# Altium footprint library PcbLib_jp.PcbLib: 255 footprints (part 4 of 16)
Each footprint in its own frame and in the unit in brackets; x right, y up, seen from the top. Pads: shape width x height; smd on the part's side, far side on the other; paste and mask are expansions set on the pad; w line width, h text height; cw(c..) or ccw(c..) is an arc to the next point about the centre after c.
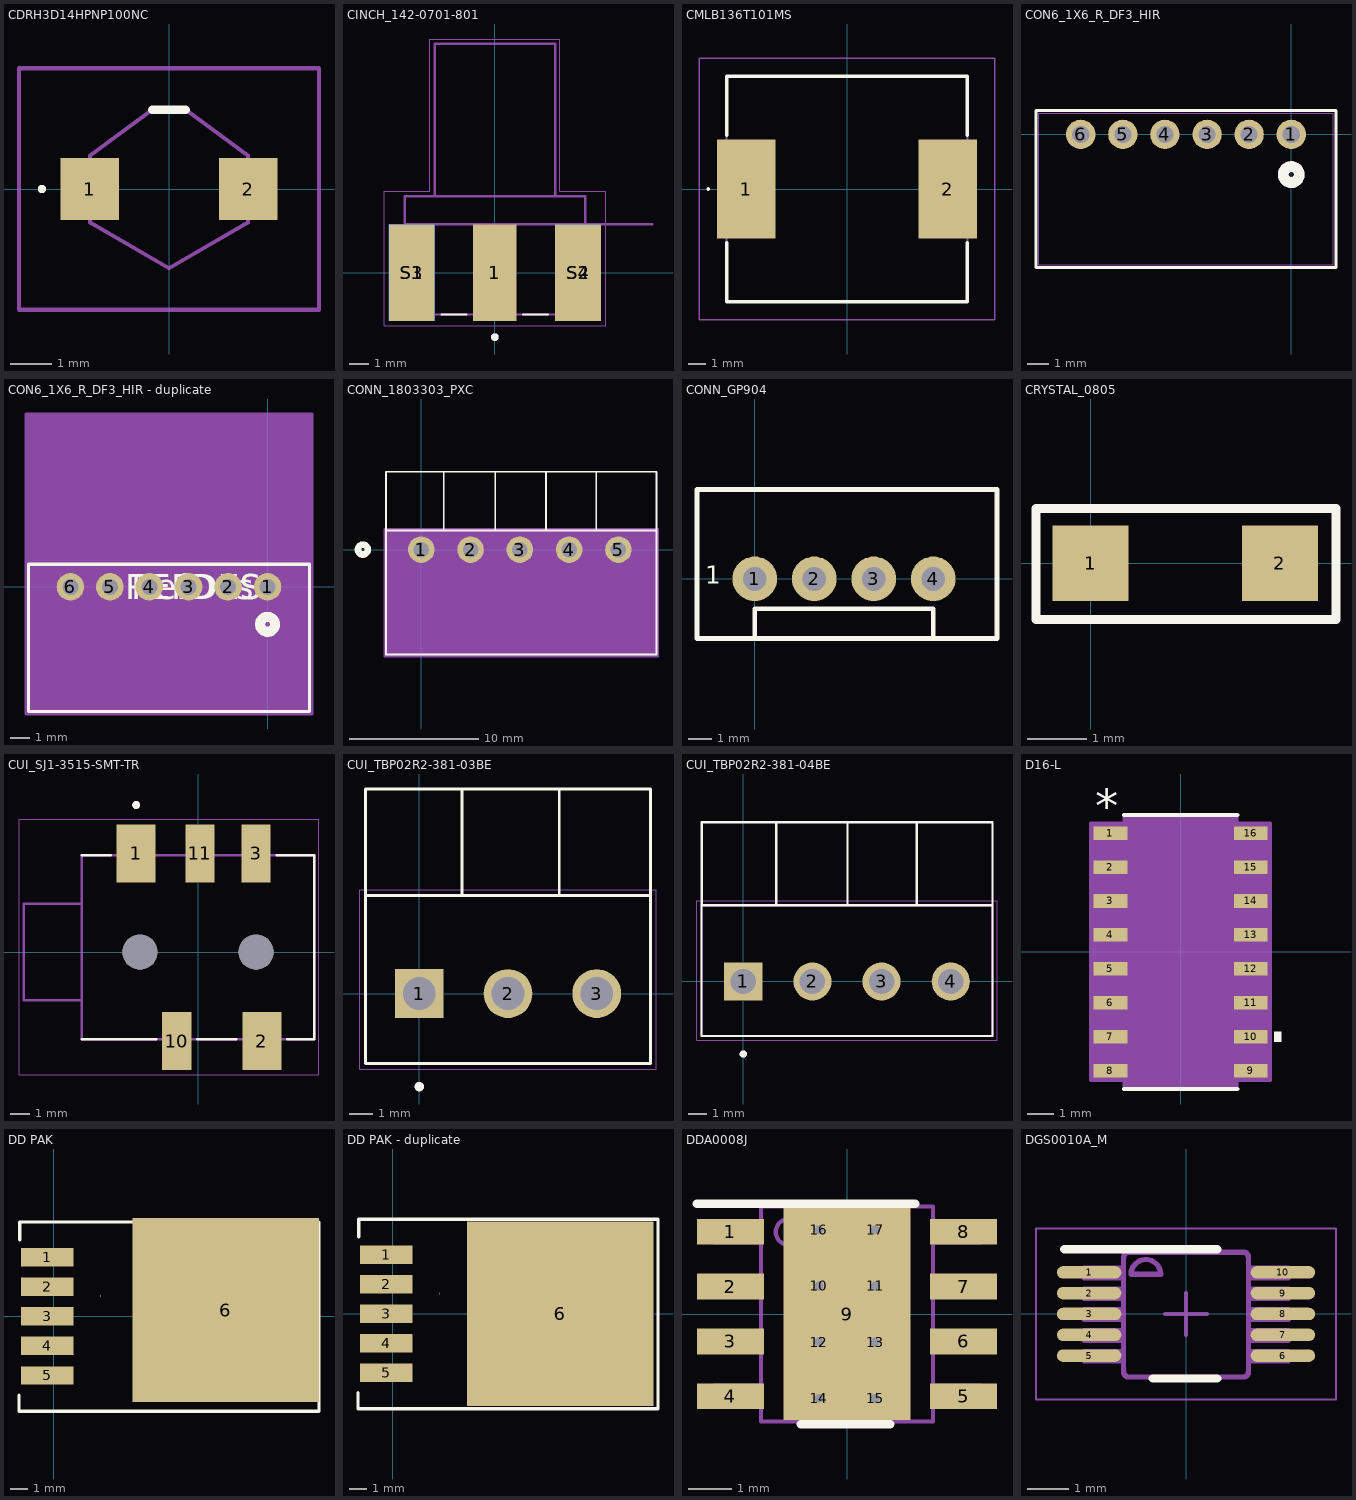
[diagram p3: the footprints below, top view; thin cyan lines are the x and y axes]

## CDRH3D14HPNP100NC [mm]
pads (2):
  rect 1.4x1.5 smd: 1(-1.9,0) 2(1.9,0)
Top Overlay:
  lines w0.1: -3.1,0 ccw(c-3.05,0) -3,0 ccw(c-3.05,0) -3.1,0
  lines w0.2: -0.4,1.9 0.4,1.9
Mechanical 13:
  lines w0.1: -1.9,-0.8 0,-1.9 1.9,-0.8 1.9,0.8 0.4,1.9 -0.4,1.9 -1.9,0.8 -1.9,-0.8
Mechanical 15:
  lines w0.1: -3.6,-2.9 3.6,-2.9 3.6,2.9 -3.6,2.9 -3.6,-2.9
3D body "CDRH3D14_HPNP-100NC.stp": height 1.35, standoff -0.35, extent -2.828,-2.828 2.828,2.828

## CINCH_142-0701-801 [mil]
height 317.17
pads (5):
  rect 90x200 smd: 1(0,0)
  rect 95x200 smd: S1(-172.5,0) S2(172.5,0)
  rect 95x200 smd far side: S3(-172.5,0) S4(172.5,0)
Top Overlay:
  circle w7.87: c0,-133.86 r3.94
  lines w5: -110.24,-87 -59.06,-87 ; 59.06,-87 110.24,-87
Mechanical 13:
  circle w7.87: c0,-133.86 r3.94
  lines w5: 188.98,100 326.77,100 ; -187.5,100 187.5,100 ; -187.5,100 -187.5,-87 187.5,-87 187.5,100 ; -187.5,100 -187.5,158.5 -125,158.5 ; -125,158.5 125,158.5 ; -125,158.5 -125,475 125,475 125,158.5 ; 125,158.5 187.5,158.5 187.5,100
  text "PCB Edge" at 248.03,114.17 h50
Mechanical 15:
  lines w1.97: -229.84,-109.84 229.84,-109.84 229.84,168.5 134.84,168.5 134.84,484.84 -134.84,484.84 -134.84,168.5 -229.84,168.5 -229.84,-109.84
3D body "step_temp.STEP": height 187.5, standoff -187.5, extent -156,-375 156,187

## CMLB136T101MS [mm]
pads (2):
  rect 3.25x5.5 smd: 1(-5.625,0) 2(5.625,0)
Top Overlay:
  lines w0.1: -7.8,0 ccw(c-7.75,0) -7.7,0 ; -7.8,0 cw(c-7.75,0) -7.7,0 ; -7.8,0 ccw(c-7.75,0) -7.7,0
  lines w0.2: -6.725,-3 -6.725,-6.3 6.725,-6.3 6.725,-3 ; -6.725,3 -6.725,6.3 6.725,6.3 6.725,3
Mechanical 13:
  lines w0.1: -6.725,-6.3 -6.725,6.3 6.725,6.3 6.725,-6.3 -6.725,-6.3
Mechanical 15:
  lines w0.1: -8.25,-7.3 -8.25,7.3 8.25,7.3 8.25,-7.3 -8.25,-7.3
3D body "CMLB136T-101MS.stp": height 6.1, standoff 0, extent -6.925,-6.3 6.925,6.3

## CON6_1X6_R_DF3_HIR [mil]
pads (6):
  round 55 / inner round 60 / far side round 55 hole 32 paste-27.5 mask-27.5: 1(0,0) 2(-78.74,0) 3(-157.48,0) 4(-236.22,0) 5(-314.96,0) 6(-393.7,0)
Top Overlay:
  circle w20: c0,-75 r15
  lines w6: -477.35,-249 83.65,-249 83.65,45 -477.35,45 -477.35,-249
Bottom Overlay:
  circle w20: c0,-75 r15
Mechanical 13:
  circle w20: c0,-75 r15
  lines w1: -472.35,-244 78.65,-244 78.65,40 -472.35,40 -472.35,-244
3D body "DF3-6P-2DS.stp": height 185.04, standoff -125.98, extent -475.98,-228.35 75.2,55.12

## CON6_1X6_R_DF3_HIR - duplicate [mil]
pads (6):
  round 55 / inner round 60 / far side round 55 hole 32 paste-27.5 mask-27.5: 1(0,0) 2(-78.74,0) 3(-157.48,0) 4(-236.22,0) 5(-314.96,0) 6(-393.7,0)
Top Overlay:
  circle w20: c0,-75 r15
  lines w6: -477.35,-249 -477.35,45 83.65,45 83.65,-249 -477.35,-249
  text "REFDES" at -284.35,-25 h50
  text "RefDes" at -271.85,-25 h50
Bottom Overlay:
  circle w20: c0,-75 r15
Mechanical 13:
  circle w20: c0,-75 r15
  lines w1: -472.35,-244 -472.35,40 78.65,40 78.65,-244 -472.35,-244
  text "RefDes2" at -284.35,-25 h50
Mechanical 15:
  region: 88.65,345 -482.35,345 -482.35,-254 88.65,-254
  lines w6: -482.35,-254 88.65,-254 88.65,345 -482.35,345 -482.35,-254

## CONN_1803303_PXC [mm]
pads (5):
  round 2.05 / inner round 1.524 / far side round 1.702 hole 1.194 paste-0.851 mask+0: 1(0,0) 2(3.81,0) 3(7.62,0) 4(11.43,0) 5(15.24,0)
Top Overlay:
  circle w0.508: c-4.51,0 r0.381
  lines w0.127: -2.72,1.47 -2.73,1.47 -2.73,6.03 18.18,6.03 18.18,1.44 18.2,1.42 ; 1.73,6.01 1.73,1.477 1.78,1.477 ; 5.72,1.477 5.72,6.01 ; 9.64,1.497 9.64,6.03 ; 13.53,1.487 13.53,6.02
  lines w0.152: -2.732,-8.124 -2.732,1.477 18.172,1.477 18.172,-8.124 -2.732,-8.124
Mechanical 13:
  lines w0.025: -2.605,-7.997 -2.605,1.35 18.045,1.35 18.045,-7.997 -2.605,-7.997
Mechanical 15:
  region: 18.299,1.604 -2.859,1.604 -2.859,-8.251 18.299,-8.251
  lines w0.152: -2.859,-8.251 18.299,-8.251 18.299,1.604 -2.859,1.604 -2.859,-8.251
3D body "pxc_1803303_05_MC-1-5-5-G-3-81_3D.stp": height 7.25, standoff -3.4, extent -2.52,-8.06 17.92,1.14

## CONN_GP904 [mil]
pads (4):
  round 75 / inner round 60 / far side round 75 hole 40: 1(0,0) 2(100,0) 3(200,0) 4(300,0)
Top Overlay:
  lines w8: 0,-100 0,-50 300,-50 300,-100 200,-100 ; -97,-100 -97,150 407,150 407,-100 -97,-100
  text "1" at -83,-8 h30
3D body "User Library-jst-b4b-xh-a-1.STEP": height 314.96, standoff -94.49, extent -89.1,-90.38 399.1,136

## CRYSTAL_0805 [mm]
height 3.5
pads (2):
  rect 1.27x1.27 smd: 1(0,0) 2(3.175,0)
Top Overlay:
  lines w0.152: -0.914,-0.94 -0.914,0.914 4.115,0.914 4.115,-0.94 -0.914,-0.94
3D body: height 1.5, standoff -0.04, extent 0,-0.6 3.2,0.6

## CUI_SJ1-3515-SMT-TR [mm]
height 5.3
pads (7):
  rect 2x3 smd: 1(-3.2,5.1) 2(3.3,-4.6)
  rect 1.5x3 smd: 3(3,5.1) 10(-1.1,-4.6) 11(0.1,5.1)
  round 1.8 hole 1.8 unplated: ""(-3,0) ""(3,0)
Top Overlay:
  circle w0.2: c-3.2,7.6 r0.1
  lines w0.127: -6,-4.5 -2.17,-4.5 ; -6,5 -4.52,5 ; -0.03,-4.5 1.98,-4.5 ; 4.07,5 6,5 6,-4.5 4.62,-4.5
Mechanical 13:
  circle w0.2: c-3.2,7.6 r0.1
  lines w0.127: -6,-2.5 -6,2.5 ; -6,-2.5 -6,-4.5 6,-4.5 6,5 -6,5 -6,2.5 ; -6,-2.5 -9,-2.5 -9,2.5 -6,2.5
Mechanical 15:
  lines w0.05: -9.25,-6.35 6.25,-6.35 6.25,6.85 -9.25,6.85 -9.25,-6.35
3D body "step_temp.STEP": height 5.1, standoff -0.9, extent -9,-6 6,6

## CUI_TBP02R2-381-03BE [mm]
pads (3):
  rect 2.1x2.1 / inner round 2.1 / far side rect 2.1x2.1 hole 1.4: 1(0,0)
  round 2.1 hole 1.4: 2(3.81,0) 3(7.62,0)
Top Overlay:
  circle w0.2: c0,-4 r0.1
  lines w0.127: -2.3,4.247 -2.3,8.78 9.92,8.78 9.92,4.247 ; 1.84,4.247 1.84,8.78 ; 6.01,4.247 6.01,8.78 ; -2.3,-3 -2.3,4.2 9.92,4.2 9.92,-3 -2.3,-3
Mechanical 13:
  circle w0.2: c0,-4 r0.1
  lines w0.127: -2.3,-3 -2.3,4.2 9.92,4.2 9.92,-3 -2.3,-3
Mechanical 15:
  lines w0.05: -2.55,-3.25 10.17,-3.25 10.17,4.45 -2.55,4.45 -2.55,-3.25
3D body "Same_Sky_TBP02R2-381-03BE.step": height 10.05, standoff -2.65, extent -2.3,-3.048 9.92,4.152

## CUI_TBP02R2-381-04BE [mm]
pads (4):
  rect 2.1x2.1 / inner round 2.1 / far side rect 2.1x2.1 hole 1.4: 1(0,0)
  round 2.1 hole 1.4: 2(3.81,0) 3(7.62,0) 4(11.43,0)
Top Overlay:
  circle w0.2: c0,-4 r0.1
  lines w0.127: -2.28,4.247 -2.28,8.78 13.73,8.78 13.73,4.247 ; 1.81,4.247 1.81,8.78 ; 5.74,4.247 5.74,8.78 ; 9.56,4.247 9.56,8.78 ; -2.3,-3 13.73,-3 13.73,4.2 -2.3,4.2 -2.3,-3
Mechanical 13:
  circle w0.2: c0,-4 r0.1
  lines w0.127: -2.3,-3 13.73,-3 13.73,4.2 -2.3,4.2 -2.3,-3
Mechanical 15:
  lines w0.05: -2.55,-3.25 -2.55,4.45 13.98,4.45 13.98,-3.25 -2.55,-3.25
3D body "Same_Sky_TBP02R2-381-04BE.step": height 9.29, standoff -3.41, extent -2.427,-2.882 13.603,4.318

## D16-L [mil]
pads (16):
  rect 49.5x20 smd paste+0 mask+0: 1(-103.25,175) 2(-103.25,125) 3(-103.25,75) 4(-103.25,25) 5(-103.25,-25) 6(-103.25,-75) 7(-103.25,-125) 8(-103.25,-175) 9(103.25,-175) 10(103.25,-125) 11(103.25,-75) 12(103.25,-25) 13(103.25,25) 14(103.25,75) 15(103.25,125) 16(103.25,175)
Top Overlay:
  region: 138,-117.5 148,-117.5 148,-132.5 138,-132.5
  lines w6: -83.5,-202 83.5,-202 ; -83.5,202 83.5,202
  text "*" at -125.75,190 h50
Mechanical 13:
  lines w0: -12,197 ccw(c0,197) 12,197
  lines w1: -122,-185 -78.5,-185 -78.5,-165 -122,-165 -122,-185 ; -122,-135 -78.5,-135 -78.5,-115 -122,-115 -122,-135 ; -122,-85 -78.5,-85 -78.5,-65 -122,-65 -122,-85 ; -122,-35 -78.5,-35 -78.5,-15 -122,-15 -122,-35 ; -122,15 -78.5,15 -78.5,35 -122,35 -122,15 ; -122,65 -78.5,65 -78.5,85 -122,85 -122,65 ; -122,115 -78.5,115 -78.5,135 -122,135 -122,115 ; -122,165 -78.5,165 -78.5,185 -122,185 -122,165 ; -78.5,-197 -78.5,197 78.5,197 78.5,-197 -78.5,-197 ; 78.5,-185 122,-185 122,-165 78.5,-165 78.5,-185 ; 78.5,-135 122,-135 122,-115 78.5,-115 78.5,-135 ; 78.5,-85 122,-85 122,-65 78.5,-65 78.5,-85 ; 78.5,-35 122,-35 122,-15 78.5,-15 78.5,-35 ; 78.5,15 122,15 122,35 78.5,35 78.5,15 ; 78.5,65 122,65 122,85 78.5,85 78.5,65 ; 78.5,115 122,115 122,135 78.5,135 78.5,115 ; 78.5,165 122,165 122,185 78.5,185 78.5,165
  text "*" at -76,144 h50
Mechanical 15:
  region: -82.5,-189 -132,-189 -132,189 -82.5,189 -82.5,201 82.5,201 82.5,189 132,189 132,-189 82.5,-189 82.5,-201 -82.5,-201
  lines w6: -132,-189 -82.5,-189 -82.5,-201 82.5,-201 82.5,-189 132,-189 132,189 82.5,189 82.5,201 -82.5,201 -82.5,189 -132,189 -132,-189
3D body "D16.step": height 69.09, standoff 0, extent -122.01,-197.01 122.01,197.01

## DD PAK [mil]
height 182.68
pads (6):
  rect 120x42 smd: 1(-15,135) 2(-15,67.5) 3(-15,0) 4(-15,-67.5) 5(-15,-135)
  rect 425x420 smd paste-50: 6(392,14)
Top Overlay:
  lines w7.87: -79.07,-180.13 -79.07,-216.13 605,-216.13 605,215 -77.27,215 -77.27,175
Mechanical 1:
  lines w1: 107.9,44.27 107.9,47.47
3D body "User Library-TO263-5S.STEP": height 204.04, standoff 15.07, extent -44.93,-194.85 572,198.85

## DD PAK - duplicate [mil]
pads (6):
  rect 120x42 smd: 1(-15,135) 2(-15,67.5) 3(-15,0) 4(-15,-67.5) 5(-15,-135)
  rect 425x420 smd: 6(382.5,0)
Top Overlay:
  lines w7.87: -79.07,-180.13 -79.07,-216.13 605,-216.13 605,215 -77.27,215 -77.27,175
Mechanical 1:
  lines w1: 107.9,44.27 107.9,47.47
3D body "User Library-TO-263BA-1.step": height 172.5, standoff -0.04, extent -42.99,-196.25 510,206.25

## DDA0008J [mm]
pads (17):
  rect 1.55x0.6 smd paste+0 mask+0.051: 1(-2.7,1.905) 2(-2.7,0.635) 3(-2.7,-0.635) 4(-2.7,-1.905) 5(2.7,-1.905) 6(2.7,-0.635) 7(2.7,0.635) 8(2.7,1.905)
  rect 2.95x4.9 smd paste-2.437 mask-2.438: 9(0,0)
  round 0.5 / inner round 1.524 / far side round 0.5 hole 0.203 paste-0.25 mask+0.051: 10(-0.65,0.65) 11(0.65,0.65) 12(-0.65,-0.65) 13(0.65,-0.65) 14(-0.65,-1.95) 15(0.65,-1.95) 16(-0.65,1.95) 17(0.65,1.95)
Top Overlay:
  lines w0.2: -3.475,2.55 1.579,2.55 ; -1.075,-2.55 1,-2.55
Top Paste:
  region: -1.3,1.55 -1.3,-1.55 1.3,-1.55 1.3,1.55
Top Solder:
  region: -1.3,1.55 -1.3,-1.55 1.3,-1.55 1.3,1.55
Mechanical 13:
  circle w0.1: c-1.35,1.9 r0.3
  lines w0.1: -3.099,-2.146 -1.994,-2.146 -1.994,-1.664 -3.099,-1.664 -3.099,-2.146 ; -3.099,-0.876 -1.994,-0.876 -1.994,-0.394 -3.099,-0.394 -3.099,-0.876 ; -3.099,0.394 -1.994,0.394 -1.994,0.876 -3.099,0.876 -3.099,0.394 ; -3.099,1.664 -1.994,1.664 -1.994,2.146 -3.099,2.146 -3.099,1.664 ; -1.994,-2.489 -1.994,2.489 1.994,2.489 1.994,-2.489 -1.994,-2.489 ; 1.994,-2.146 3.099,-2.146 3.099,-1.664 1.994,-1.664 1.994,-2.146 ; 1.994,-0.876 3.099,-0.876 3.099,-0.394 1.994,-0.394 1.994,-0.876 ; 1.994,0.394 3.099,0.394 3.099,0.876 1.994,0.876 1.994,0.394 ; 1.994,1.664 3.099,1.664 3.099,2.146 1.994,2.146 1.994,1.664
3D body "DDA0008J.stp": height 1.57, standoff 0, extent -3.014,-2.45 3.014,2.45

## DGS0010A_M [mm]
pads (10):
  oval 1.55x0.3 smd paste+0 mask+0.051: 1(-2.325,1) 2(-2.325,0.5) 3(-2.325,0) 4(-2.325,-0.5) 5(-2.325,-1) 6(2.325,-1) 7(2.325,-0.5) 8(2.325,0) 9(2.325,0.5) 10(2.325,1)
Top Overlay:
  lines w0.2: -2.925,1.55 0.75,1.55 ; -0.8,-1.55 0.75,-1.55
Mechanical 13:
  lines w0.127: -2.45,-1.128 -2.45,-0.899 -2.21,-0.899 -2.09,-0.899 -2.087,-0.899 -1.784,-0.899 -1.498,-0.899 -1.498,-1.128 -1.784,-1.128 -2.087,-1.128 -2.09,-1.128 -2.21,-1.128 -2.45,-1.128 ; -2.45,-0.628 -2.45,-0.4 -2.21,-0.4 -2.09,-0.4 -2.087,-0.4 -1.784,-0.4 -1.498,-0.4 -1.498,-0.628 -1.784,-0.628 -2.087,-0.628 -2.09,-0.628 -2.21,-0.628 -2.45,-0.628 ; -2.45,-0.128 -2.45,0.1 -2.21,0.1 -2.09,0.1 -2.087,0.1 -1.784,0.1 -1.498,0.1 -1.498,-0.128 -1.784,-0.128 -2.087,-0.128 -2.09,-0.128 -2.21,-0.128 -2.45,-0.128 ; -2.45,0.372 -2.45,0.6 -2.21,0.6 -2.09,0.6 -2.087,0.6 -1.784,0.6 -1.498,0.6 -1.498,0.372 -1.784,0.372 -2.087,0.372 -2.09,0.372 -2.21,0.372 -2.45,0.372 ; -2.45,0.871 -2.45,1.1 -2.21,1.1 -2.09,1.1 -2.087,1.1 -1.784,1.1 -1.498,1.1 -1.498,0.871 -1.784,0.871 -2.087,0.871 -2.09,0.871 -2.21,0.871 -2.45,0.871 ; -1.497,-1.388 ccw(c-1.37,-1.386) -1.373,-1.513 -1.371,-1.513 1.373,-1.513 1.375,-1.513 ccw(c1.373,-1.386) 1.5,-1.388 1.5,-1.386 1.5,1.358 1.5,1.36 ccw(c1.373,1.358) 1.375,1.485 1.373,1.485 -1.371,1.485 -1.373,1.485 ccw(c-1.37,1.358) -1.497,1.36 -1.498,1.358 -1.498,-1.386 -1.497,-1.388 ; -1.32,0.951 cw(c-0.964,0.951) -0.609,0.951 -1.32,0.951 ; 1.5,-1.128 1.5,-0.899 1.786,-0.899 2.089,-0.899 2.093,-0.899 2.213,-0.899 2.452,-0.899 2.452,-1.128 2.213,-1.128 2.093,-1.128 2.089,-1.128 1.786,-1.128 1.5,-1.128 ; 1.5,-0.628 1.5,-0.4 1.786,-0.4 2.089,-0.4 2.093,-0.4 2.213,-0.4 2.452,-0.4 2.452,-0.628 2.213,-0.628 2.093,-0.628 2.089,-0.628 1.786,-0.628 1.5,-0.628 ; 1.5,-0.128 1.5,0.1 1.786,0.1 2.089,0.1 2.093,0.1 2.213,0.1 2.452,0.1 2.452,-0.128 2.213,-0.128 2.093,-0.128 2.089,-0.128 1.786,-0.128 1.5,-0.128 ; 1.5,0.372 1.5,0.6 1.786,0.6 2.089,0.6 2.093,0.6 2.213,0.6 2.452,0.6 2.452,0.372 2.213,0.372 2.093,0.372 2.089,0.372 1.786,0.372 1.5,0.372 ; 1.5,0.871 1.5,1.1 1.786,1.1 2.089,1.1 2.093,1.1 2.213,1.1 2.452,1.1 2.452,0.871 2.213,0.871 2.093,0.871 2.089,0.871 1.786,0.871 1.5,0.871
Mechanical 15:
  lines w0.05: -3.6,-2.05 -3.6,2.05 3.6,2.05 3.6,-2.05 -3.6,-2.05
  lines w0.1: -0.5,0 0.5,0 ; 0,-0.5 0,0.5
3D body "DGS0010A.stp": height 1.41, standoff 0.31, extent -2.443,-1.51 2.483,1.49